# Altium footprint library FOC.PcbLib: 148 footprints (part 10 of 10)
Each footprint in its own frame and in the unit in brackets; x right, y up, seen from the top. Pads: shape width x height; smd on the part's side, far side on the other; paste and mask are expansions set on the pad; w line width, h text height; cw(c..) or ccw(c..) is an arc to the next point about the centre after c.
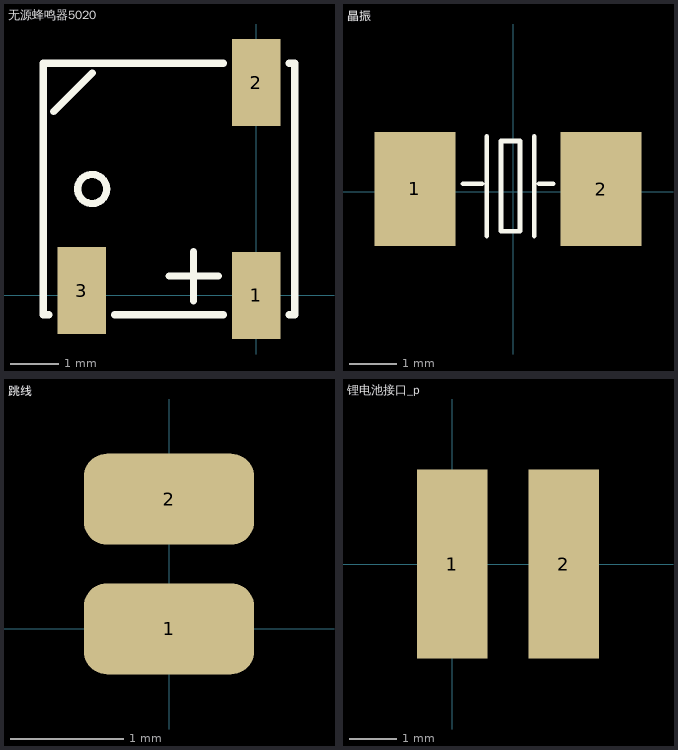
[diagram p9: the footprints below, top view; thin cyan lines are the x and y axes]

## 无源蜂鸣器5020 [mm]
pads (3):
  rect 1x1.8 smd: 1(0,0) 2(0,4.402) 3(-3.601,0.099)
Top Overlay:
  circle w0.15: c-3.389,2.201 r0.3
  lines w0.15: -4.28,-0.399 -4.4,-0.399 -4.4,4.801 -4.2,4.801 -0.679,4.801 ; -4.189,3.801 -3.389,4.601 ; -2.922,-0.399 -0.679,-0.399 ; -1.8,0.401 -0.784,0.401 ; -1.292,-0.107 -1.292,0.909 ; 0.679,-0.399 0.8,-0.399 0.8,4.801 0.679,4.801
3D body: height 7, standoff -3.7, extent -3.683,4.064 -3.683,4.064
3D body "SMD,5x5mm.STEP": height 2.01, standoff 0, extent -4.411,-0.38 0.865,4.82

## 晶振 [mm] "XTAL_SMD5032"
height 2
pads (2):
  rect 1.7x2.4 smd: 1(-2.071,0.058) 2(1.85,0.057)
Top Overlay:
  lines w0.1: -1.057,0.167 -0.657,0.167 ; -0.557,-0.933 -0.557,1.167 ; 0.443,-0.933 0.443,1.167 ; 0.543,0.167 0.843,0.167 ; -0.257,-0.833 0.143,-0.833 0.143,1.067 -0.257,1.067 -0.257,-0.833
3D body "SMD5032-2P.STEP": height 1.41, standoff -0.01, extent -2.569,-1.451 2.431,1.749

## 跳线 [mm] "download"
pads (2):
  rrect50% 1.5x0.8 smd: 1(0,0) 2(0,1.143)

## 锂电池接口_p [mm]
pads (2):
  rect 1.5x4 smd: 1(0,0) 2(2.362,0)